# Altium footprint library Connectors_Old.PcbLib: 246 footprints (part 1 of 18)
Each footprint in its own frame and in the unit in brackets; x right, y up, seen from the top. Pads: shape width x height; smd on the part's side, far side on the other; paste and mask are expansions set on the pad; w line width, h text height; cw(c..) or ccw(c..) is an arc to the next point about the centre after c.
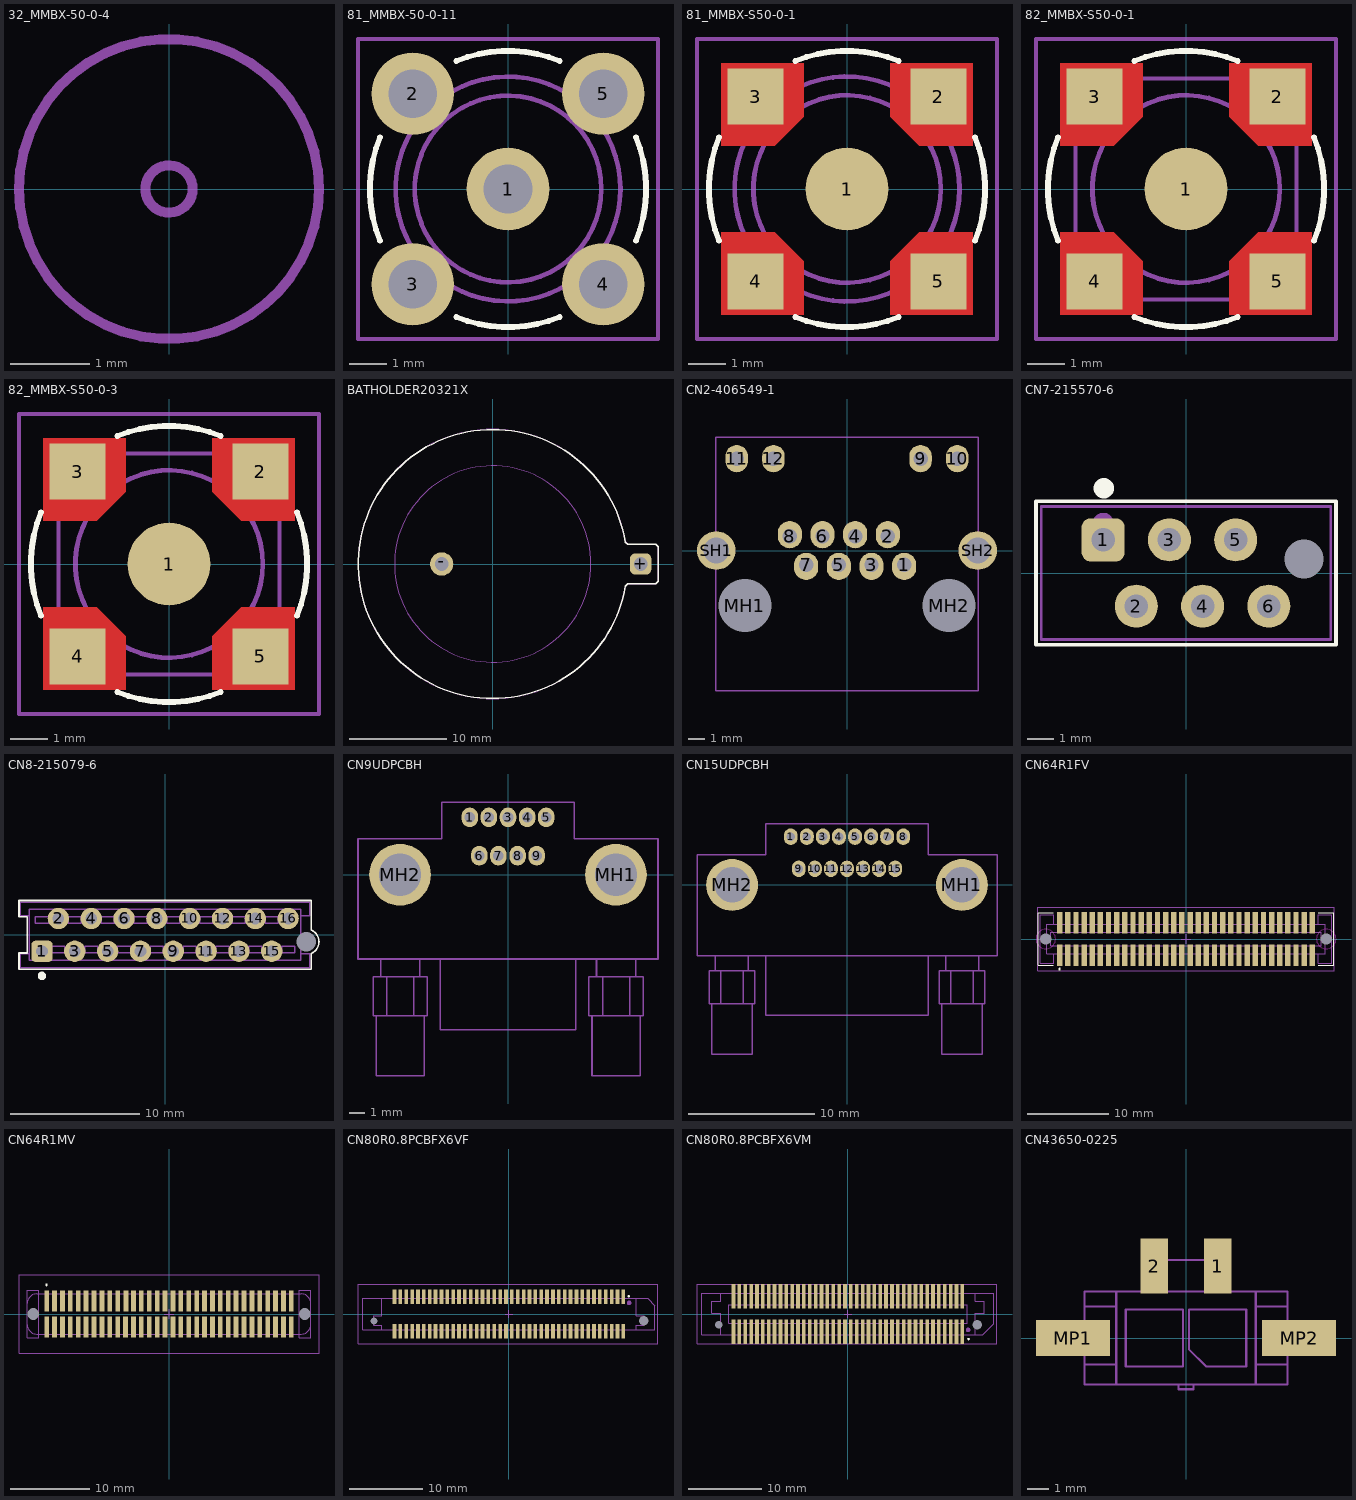
[diagram p0: the footprints below, top view; thin cyan lines are the x and y axes]

## 32_MMBX-50-0-4 [mm] "MMBX adapter 8mm"
height 9
Mechanical 13:
  circle w0.127: c0,0 r0.3
  circle w0.127: c0,0 r1.9
3D body: height 9, standoff 1, extent -1.9,-1.899 1.899,1.899

## 81_MMBX-50-0-11 [mm]
pads (5):
  round 2.2 hole 1.3: 1(0,0) 2(-2.54,2.54) 3(-2.54,-2.54) 4(2.54,-2.54) 5(2.54,2.54)
Top Overlay:
  lines w0.15: -3.415,-1.38 cw(c0,0) -3.415,1.38 ; -1.38,-3.415 ccw(c0,0) 1.38,-3.415 ; -1.38,3.415 cw(c0,0) 1.38,3.415 ; 3.415,-1.38 ccw(c0,0) 3.415,1.38
Mechanical 13:
  circle w0.127: c0,0 r2.997
  circle w0.127: c0,0 r2.489
  circle w0.508: c0,0 r0.254
Mechanical 15:
  lines w0.102: -0.55,0 0.55,0 ; 0,-0.6 0,0.6 ; -4,-4 -4,4 4,4 4,-4 -4,-4
3D body: height 9.02, standoff -3.38, extent -3.065,-3.065 3.065,3.065

## 81_MMBX-S50-0-1 [mm] "MMBX connector, PCB plug (male), SMD"
height 6.1
pads (5):
  round 2.2 smd: 1(0,0)
  rect 1.5x1.5 smd: 2(2.438,2.464) 3(-2.438,2.464) 4(-2.438,-2.464) 5(2.438,-2.464)
Top Layer:
  region: 1.15,1.93 1.93,1.15 3.35,1.15 3.35,3.35 1.15,3.35
  region: -1.15,1.93 -1.93,1.15 -3.35,1.15 -3.35,3.35 -1.15,3.35
  region: -1.15,-1.93 -1.93,-1.15 -3.35,-1.15 -3.35,-3.35 -1.15,-3.35
  region: 1.15,-1.93 1.93,-1.15 3.35,-1.15 3.35,-3.35 1.15,-3.35
Top Overlay:
  lines w0.15: -3.415,-1.38 cw(c0,0) -3.415,1.38 ; -1.38,-3.415 ccw(c0,0) 1.38,-3.415 ; -1.38,3.415 cw(c0,0) 1.38,3.415 ; 3.415,-1.38 ccw(c0,0) 3.415,1.38
Top Paste:
  region: 1.15,3.35 1.15,1.93 1.93,1.15 3.35,1.15 3.35,3.35
  region: -1.15,3.35 -1.15,1.93 -1.93,1.15 -3.35,1.15 -3.35,3.35
  region: -1.15,-3.35 -1.15,-1.93 -1.93,-1.15 -3.35,-1.15 -3.35,-3.35
  region: 1.15,-3.35 1.15,-1.93 1.93,-1.15 3.35,-1.15 3.35,-3.35
Top Solder:
  region: 1.016,3.48 1.016,1.778 1.778,1.016 3.48,1.016 3.48,3.48
  region: -1.016,3.48 -1.016,1.778 -1.778,1.016 -3.48,1.016 -3.48,3.48
  region: -1.016,-3.48 -1.016,-1.778 -1.778,-1.016 -3.48,-1.016 -3.48,-3.48
  region: 1.016,-3.48 1.016,-1.778 1.778,-1.016 3.48,-1.016 3.48,-3.48
Mechanical 13:
  circle w0.127: c0,0 r3
  circle w0.127: c0,0 r2.5
  lines w0.102: -2.667,-1.397 -3.048,-1.397 -3.048,-3.048 -1.377,-3.048 -1.377,-2.707 ; -2.667,1.397 -3.048,1.397 -3.048,3.048 -1.377,3.048 -1.377,2.707 ; 1.377,-2.707 1.377,-3.048 3.048,-3.048 3.048,-1.397 2.667,-1.397 ; 1.377,2.707 1.377,3.048 3.048,3.048 3.048,1.397 2.667,1.397
Mechanical 15:
  lines w0.102: -0.55,0 0.55,0 ; 0,-0.6 0,0.6 ; -4,-4 -4,4 4,4 4,-4 -4,-4
3D body: height 5.77, standoff 0.02, extent -3.066,-3.066 3.066,3.066

## 82_MMBX-S50-0-1 [mm] "MMBX connector, PCB plug (female), SMD"
height 3.1
pads (5):
  round 2.2 smd: 1(0,0)
  rect 1.5x1.5 smd: 2(2.438,2.464) 3(-2.438,2.464) 4(-2.438,-2.464) 5(2.438,-2.464)
Top Layer:
  region: 1.15,1.93 1.93,1.15 3.35,1.15 3.35,3.35 1.15,3.35
  region: -1.15,1.93 -1.93,1.15 -3.35,1.15 -3.35,3.35 -1.15,3.35
  region: -1.15,-1.93 -1.93,-1.15 -3.35,-1.15 -3.35,-3.35 -1.15,-3.35
  region: 1.15,-1.93 1.93,-1.15 3.35,-1.15 3.35,-3.35 1.15,-3.35
Top Overlay:
  lines w0.15: -3.415,-1.38 cw(c0,0) -3.415,1.38 ; -1.38,-3.415 ccw(c0,0) 1.38,-3.415 ; -1.38,3.415 cw(c0,0) 1.38,3.415 ; 3.415,-1.38 ccw(c0,0) 3.415,1.38
Top Paste:
  region: 1.15,3.35 1.15,1.93 1.93,1.15 3.35,1.15 3.35,3.35
  region: -1.15,3.35 -1.15,1.93 -1.93,1.15 -3.35,1.15 -3.35,3.35
  region: -1.15,-3.35 -1.15,-1.93 -1.93,-1.15 -3.35,-1.15 -3.35,-3.35
  region: 1.15,-3.35 1.15,-1.93 1.93,-1.15 3.35,-1.15 3.35,-3.35
Top Solder:
  region: 1.016,3.48 1.016,1.778 1.778,1.016 3.48,1.016 3.48,3.48
  region: -1.016,3.48 -1.016,1.778 -1.778,1.016 -3.48,1.016 -3.48,3.48
  region: -1.016,-3.48 -1.016,-1.778 -1.778,-1.016 -3.48,-1.016 -3.48,-3.48
  region: 1.016,-3.48 1.016,-1.778 1.778,-1.016 3.48,-1.016 3.48,-3.48
Mechanical 13:
  circle w0.127: c0,0 r2.5
  lines w0.102: 2.616,-2.95 2.95,-2.616 2.95,2.616 2.616,2.95 -2.616,2.95 -2.95,2.616 -2.95,-2.616 -2.616,-2.95 2.642,-2.95
Mechanical 15:
  lines w0.102: -0.55,0 0.55,0 ; 0,-0.6 0,0.6 ; -4,-4 -4,4 4,4 4,-4 -4,-4
3D body: height 3.12, standoff 0.02, extent -3.066,-3.066 3.066,3.066

## 82_MMBX-S50-0-3 [mm] "MMBX connector, PCB plug (male), SMD"
height 9
pads (5):
  round 2.2 smd: 1(0,0)
  rect 1.5x1.5 smd: 2(2.438,2.464) 3(-2.438,2.464) 4(-2.438,-2.464) 5(2.438,-2.464)
Top Layer:
  region: 1.15,1.93 1.93,1.15 3.35,1.15 3.35,3.35 1.15,3.35
  region: -1.15,1.93 -1.93,1.15 -3.35,1.15 -3.35,3.35 -1.15,3.35
  region: -1.15,-1.93 -1.93,-1.15 -3.35,-1.15 -3.35,-3.35 -1.15,-3.35
  region: 1.15,-1.93 1.93,-1.15 3.35,-1.15 3.35,-3.35 1.15,-3.35
Top Overlay:
  lines w0.15: -3.415,-1.38 cw(c0,0) -3.415,1.38 ; -1.38,-3.415 ccw(c0,0) 1.38,-3.415 ; -1.38,3.415 cw(c0,0) 1.38,3.415 ; 3.415,-1.38 ccw(c0,0) 3.415,1.38
Top Paste:
  region: 1.15,3.35 1.15,1.93 1.93,1.15 3.35,1.15 3.35,3.35
  region: -1.15,3.35 -1.15,1.93 -1.93,1.15 -3.35,1.15 -3.35,3.35
  region: -1.15,-3.35 -1.15,-1.93 -1.93,-1.15 -3.35,-1.15 -3.35,-3.35
  region: 1.15,-3.35 1.15,-1.93 1.93,-1.15 3.35,-1.15 3.35,-3.35
Top Solder:
  region: 1.016,3.48 1.016,1.778 1.778,1.016 3.48,1.016 3.48,3.48
  region: -1.016,3.48 -1.016,1.778 -1.778,1.016 -3.48,1.016 -3.48,3.48
  region: -1.016,-3.48 -1.016,-1.778 -1.778,-1.016 -3.48,-1.016 -3.48,-3.48
  region: 1.016,-3.48 1.016,-1.778 1.778,-1.016 3.48,-1.016 3.48,-3.48
Mechanical 13:
  circle w0.127: c0,0 r2.5
  lines w0.102: 2.616,-2.95 2.95,-2.616 2.95,2.616 2.616,2.95 -2.616,2.95 -2.95,2.616 -2.95,-2.616 -2.616,-2.95 2.642,-2.95
Mechanical 15:
  lines w0.102: -0.55,0 0.55,0 ; 0,-0.6 0,0.6 ; -4,-4 -4,4 4,4 4,-4 -4,-4
3D body: height 3.47, standoff 0.01, extent -2.95,-2.947 2.95,2.954

## BATHOLDER20321X [mm]
height 8.509
pads (2):
  rrect50% 2.2x2.2 hole 1.4: +(15.24,0)
  round 2.4 hole 1.4: -(-5.258,0)
Top Overlay:
  lines w0.15: 13.653,-2.284 cw(c0,0) 13.658,2.255 13.881,2.032 16.764,2.032 17.018,1.778 17.018,-1.778 16.764,-2.032 13.905,-2.032 13.653,-2.284
Mechanical 13:
  circle w0.102: c0,0 r10.109
  lines w0.102: 13.675,2.275 13.918,2.032 16.764,2.032 17.018,1.778 17.018,-1.795 16.764,-2.049 13.911,-2.049 13.68,-2.28 cw(c0,0) 13.68,2.28

## CN2-406549-1 [mm] "Connector RJ45 for AMC 8pin pressfit 15.75x16.3x13.97"
height 7.38
pads (16):
  oval 1.5x1.7 hole 0.9 copper offset 0,-0.1: 1(3.556,-0.889) 3(1.524,-0.889) 5(-0.508,-0.889) 7(-2.54,-0.889)
  oval 1.5x1.7 hole 0.9 copper offset 0,0.1: 2(2.54,0.889) 4(0.508,0.889) 6(-1.524,0.889) 8(-3.556,0.889)
  oval 1.4x1.7 hole 0.9: 9(4.572,5.715) 10(6.858,5.715) 11(-6.858,5.715) 12(-4.572,5.715)
  round 3 hole 3.3 unplated: MH1(-6.35,-3.429) MH2(6.35,-3.429)
  round 2.4 hole 1.6: SH1(-8.128,0) SH2(8.128,0)
Mechanical 13:
  lines w0.1: -8.15,-8.712 -8.15,7.036 8.15,7.036 8.15,-8.712 -8.15,-8.712
3D body: height 14.61, standoff -4.11, extent -9.313,-9.685 9.315,7.036

## CN7-215570-6 [mil] "AMP u Match 6pin vertical female"
height 118.11
pads (7):
  round 0 hole 59.06 unplated paste-90 mask+43: 0(178.15,20.87)
  rrect40% 65x65 hole 35.43: 1(-125,50)
  round 65 hole 35.43: 2(-75,-50) 3(-25,50) 4(25,-50) 5(75,50) 6(125,-50)
Top Overlay:
  circle w15.75: c-124.02,127.95 r7.48
  lines w5.91: -226.38,-108.27 -226.38,108.27 226.38,108.27 226.38,-108.27 -226.38,-108.27
Mechanical 13:
  circle w15.75: c-125,75 r7.87
  lines w4: -218.5,-100.39 -218.5,100.39 218.5,100.39 218.5,-100.39 -218.5,-100.39 ; -145,35 -145,55 -105,55 -105,35 -145,35 ; -95,-55 -55,-55 -55,-35 -95,-35 -95,-55 ; -45,35 -5,35 -5,55 -45,55 -45,35 ; 5,-55 45,-55 45,-35 5,-35 5,-55 ; 55,35 95,35 95,55 55,55 55,35 ; 105,-55 145,-55 145,-35 105,-35 105,-55
3D body: height 198.82, standoff -124.02, extent -216.07,-98.43 217,98.43

## CN8-215079-6 [mil] "AMP u Match 16pin vertical cable"
height 118.11
pads (17):
  rrect40% 65x65 hole 35.43: 1(-375,-50)
  round 65 hole 35.43: 2(-325,50) 3(-275,-50) 4(-225,50) 5(-175,-50) 6(-125,50) 7(-75,-50) 8(-25,50) 9(25,-50) 10(75,50) 11(125,-50) 12(175,50) 13(225,-50) 14(275,50) 15(325,-50) 16(375,50)
  round 0 hole 59.06 unplated mask+35.43: MH1(430.12,-20.87)
Top Overlay:
  circle w15.75: c-375,-125 r5
  lines w5: 445,-56.71 445,-105 -445,-105 -445,-55 -420,-55 -420,55 -445,55 -445,105 445,105 445,15 ; 445.04,-56.71 ccw(c430.12,-20.87) 445.04,14.98
Mechanical 13:
  circle w15.75: c-375,-50 r7.87
  lines w4: -413.39,-58.07 -440.94,-58.07 -440.94,-100 440.94,-100 440.94,-58.07 413.39,-58.07 ; -413.39,58.07 -440.94,58.07 -440.94,100 440.94,100 440.94,58.07 413.39,58.07 ; -413.39,-77.76 -413.39,77.76 413.39,77.76 413.39,-77.76 -413.39,-77.76 ; -395,35 -395,55 -355,55 -355,35 -395,35 ; -345,-55 -305,-55 -305,-35 -345,-35 -345,-55 ; -295,35 -255,35 -255,55 -295,55 -295,35 ; -245,-55 -205,-55 -205,-35 -245,-35 -245,-55 ; -195,35 -155,35 -155,55 -195,55 -195,35 ; -145,-55 -105,-55 -105,-35 -145,-35 -145,-55 ; -95,35 -95,55 -55,55 -55,35 -95,35 ; -45,-55 -45,-35 -5,-35 -5,-55 -45,-55 ; 5,35 5,55 45,55 45,35 5,35 ; 55,-55 55,-35 95,-35 95,-55 55,-55 ; 105,35 105,55 145,55 145,35 105,35 ; 155,-55 155,-35 195,-35 195,-55 155,-55 ; 205,35 205,55 245,55 245,35 205,35 ; 255,-55 255,-35 295,-35 295,-55 255,-55 ; 305,35 305,55 345,55 345,35 305,35 ; 355,-55 355,-35 395,-35 395,-55 355,-55
3D body: height 157.48, standoff -118.11, extent -437.01,-98.43 438.98,98.43

## CN9UDPCBH [mm] "Connector LXI Horizontal, THDM; 9 pin; R1.27 mm; Body 19.94 x 15.13 x 7.86 mm (LxWxH)"
height 7.82
pads (11):
  oval 1.1x1.3 hole 0.7 mask+0.051: 1(-2.54,3.81) 2(-1.27,3.81) 3(0,3.81) 4(1.27,3.81) 5(2.54,3.81) 6(-1.905,1.27) 7(-0.635,1.27) 8(0.635,1.27) 9(1.905,1.27)
  round 4.1 hole 2.8: MH1(7.175,0) MH2(-7.175,0)
Mechanical 13:
  lines w0.102: -8.767,-9.372 -8.767,-13.372 -5.567,-13.372 -5.567,-9.372 ; -8.467,-6.772 -8.467,-5.6 ; -8.067,-9.372 -8.067,-6.772 ; -6.267,-9.372 -6.267,-6.772 ; -5.867,-6.772 -5.867,-5.6 ; -4.5,-5.6 -4.5,-10.3 4.5,-10.3 4.5,-5.6 ; 5.583,-9.372 5.583,-13.372 8.783,-13.372 8.783,-9.372 ; 5.883,-6.772 5.883,-5.6 ; 6.283,-9.372 6.283,-6.772 ; 8.083,-9.372 8.083,-6.772 ; 8.483,-6.772 8.483,-5.6 ; -9.97,-5.6 9.97,-5.6 9.97,2.4 4.4,2.4 4.4,4.83 -4.4,4.83 -4.4,2.4 -9.97,2.4 -9.97,-5.6 ; -8.967,-9.372 -5.367,-9.372 -5.367,-6.772 -8.967,-6.772 -8.967,-9.372 ; 5.383,-9.372 8.983,-9.372 8.983,-6.772 5.383,-6.772 5.383,-9.372
3D body: height 5.4, standoff 2.21, extent 5.583,-13.382 8.776,-9.382
3D body: height 5.6, standoff 2.01, extent 5.383,-9.382 8.975,-6.782
3D body: height 5.1, standoff 2.51, extent 5.883,-6.782 8.477,-5.6
3D body: height 5.4, standoff 2.21, extent -8.767,-13.382 -5.574,-9.382
3D body: height 5.6, standoff 2.01, extent -8.967,-9.382 -5.375,-6.782
3D body: height 5.1, standoff 2.51, extent -8.467,-6.782 -5.873,-5.6
3D body: height 0, standoff -2.8, extent 5.753,-1.409 8.571,1.409
3D body: height 0, standoff -2.8, extent -8.597,-1.409 -5.779,1.409
3D body: height 0, standoff -2.8, extent -2.268,0.907 -1.542,1.633
3D body: height 0, standoff -2.8, extent -0.998,0.907 -0.272,1.633
3D body: height 0, standoff -2.8, extent 0.272,0.907 0.998,1.633
3D body: height 0, standoff -2.8, extent 1.542,0.907 2.268,1.633
3D body: height 0, standoff -2.8, extent 2.177,3.447 2.903,4.173
3D body: height 0, standoff -2.8, extent 0.907,3.447 1.633,4.173
3D body: height 0, standoff -2.8, extent -0.363,3.447 0.363,4.173
3D body: height 0, standoff -2.8, extent -1.633,3.447 -0.907,4.173
3D body: height 0, standoff -2.8, extent -2.903,3.447 -2.177,4.173
3D body: height 7.82, standoff 0, extent -9.97,-5.2 9.97,4.83
3D body: height 7.82, standoff 0, extent -9.97,-5.6 9.97,-5.2
3D body: height 7.11, standoff 0.51, extent -4.5,-10.3 4.5,-5.6
3D body: height 6.01, standoff 1.61, extent -3.9,-10.4 3.9,-10.3

## CN15UDPCBH [mm] "Connector LXI Horizontal, THDM; 9 pin; R1.27 mm; Body 19.94 x 15.13 x 7.86 mm (LxWxH)"
height 7.82
pads (17):
  oval 1.1x1.3 hole 0.7 mask+0.051: 1(-4.445,3.81) 2(-3.175,3.81) 3(-1.905,3.81) 4(-0.635,3.81) 5(0.635,3.81) 6(1.905,3.81) 7(3.175,3.81) 8(4.445,3.81) 9(-3.81,1.27) 10(-2.54,1.27) 11(-1.27,1.27) 12(0,1.27) 13(1.27,1.27) 14(2.54,1.27) 15(3.81,1.27)
  round 4.1 hole 2.8: MH1(9.08,0) MH2(-9.08,0)
Mechanical 13:
  lines w0.102: -10.689,-9.372 -10.689,-13.372 -7.489,-13.372 -7.489,-9.372 ; -10.389,-6.772 -10.389,-5.6 ; -9.989,-9.372 -9.989,-6.772 ; -8.189,-9.372 -8.189,-6.772 ; -7.789,-6.772 -7.789,-5.6 ; -6.426,-5.602 -6.426,-10.302 6.426,-10.287 6.426,-5.587 ; 7.489,-9.372 7.489,-13.372 10.689,-13.372 10.689,-9.372 ; 7.789,-6.772 7.789,-5.6 ; 8.189,-9.372 8.189,-6.772 ; 9.989,-9.372 9.989,-6.772 ; 10.389,-6.772 10.389,-5.6 ; -11.849,-5.6 11.849,-5.6 11.849,2.4 6.426,2.4 6.426,4.83 -6.426,4.83 -6.426,2.4 -11.849,2.4 -11.849,-5.6 ; -10.889,-9.372 -7.289,-9.372 -7.289,-6.772 -10.889,-6.772 -10.889,-9.372 ; 7.289,-9.372 10.889,-9.372 10.889,-6.772 7.289,-6.772 7.289,-9.372
3D body: height 0, standoff -2.8, extent 7.67,-1.409 10.489,1.409
3D body: height 0, standoff -2.8, extent -10.49,-1.409 -7.671,1.409
3D body: height 0, standoff -2.8, extent -4.173,0.907 -3.447,1.633
3D body: height 0, standoff -2.8, extent -2.903,0.907 -2.177,1.633
3D body: height 0, standoff -2.8, extent 3.447,0.907 4.173,1.633
3D body: height 0, standoff -2.8, extent 0.907,0.907 1.633,1.633
3D body: height 0, standoff -2.8, extent 4.082,3.447 4.808,4.173
3D body: height 0, standoff -2.8, extent -3.538,3.447 -2.812,4.173
3D body: height 0, standoff -2.8, extent -4.808,3.447 -4.082,4.173
3D body: height 7.82, standoff 0, extent -11.849,-5.232 11.849,4.83
3D body: height 7.82, standoff 0, extent -11.849,-5.6 11.849,-5.2
3D body: height 7.11, standoff 0.51, extent -6.426,-10.302 6.426,-5.6
3D body: height 6.01, standoff 1.61, extent -5.807,-10.4 5.806,-10.3
3D body: height 5.11, standoff 2.51, extent -10.389,-6.77 -7.799,-5.6
3D body: height 0, standoff -2.8, extent -0.363,0.907 0.363,1.633
3D body: height 0, standoff -2.8, extent -1.633,0.907 -0.907,1.633
3D body: height 0, standoff -2.8, extent -2.268,3.447 -1.542,4.173
3D body: height 0, standoff -2.8, extent -0.998,3.447 -0.272,4.173
3D body: height 0, standoff -2.8, extent 0.272,3.447 0.998,4.173
3D body: height 0, standoff -2.8, extent 1.542,3.447 2.268,4.173
3D body: height 0, standoff -2.8, extent 2.812,3.447 3.538,4.173
3D body: height 0, standoff -2.8, extent 2.177,0.907 2.903,1.633
3D body: height 5.61, standoff 2.01, extent -10.887,-9.37 -7.301,-6.77
3D body: height 5.41, standoff 2.21, extent -10.694,-13.372 -7.506,-9.372
3D body: height 5.41, standoff 2.21, extent 7.506,-13.37 10.694,-9.37
3D body: height 5.61, standoff 2.01, extent 7.307,-9.37 10.893,-6.77
3D body: height 5.11, standoff 2.51, extent 7.805,-6.77 10.395,-5.6

## CN64R1FV [mm] "71439-0864"
height 5
pads (66):
  rect 0.66x2.642 smd: 1(-15.5,-2) 2(-15.5,2) 3(-14.5,-2) 4(-14.5,2) 5(-13.5,-2) 6(-13.5,2) 7(-12.5,-2) 8(-12.5,2) 9(-11.5,-2) 10(-11.5,2) 11(-10.5,-2) 12(-10.5,2) 13(-9.5,-2) 14(-9.5,2) 15(-8.5,-2) 16(-8.5,2) 17(-7.5,-2) 18(-7.5,2) 19(-6.5,-2) 20(-6.5,2) 21(-5.5,-2) 22(-5.5,2) 23(-4.5,-2) 24(-4.5,2) 25(-3.5,-2) 26(-3.5,2) 27(-2.5,-2) 28(-2.5,2) 29(-1.5,-2) 30(-1.5,2) 31(-0.5,-2) 32(-0.5,2) 33(0.5,-2) 34(0.5,2) 35(1.5,-2) 36(1.5,2) 37(2.5,-2) 38(2.5,2) 39(3.5,-2) 40(3.5,2) 41(4.5,-2) 42(4.5,2) 43(5.5,-2) 44(5.5,2) 45(6.5,-2) 46(6.5,2) 47(7.5,-2) 48(7.5,2) 49(8.5,-2) 50(8.5,2) 51(9.5,-2) 52(9.5,2) 53(10.5,-2) 54(10.5,2) 55(11.5,-2) 56(11.5,2) 57(12.5,-2) 58(12.5,2) 59(13.5,-2) 60(13.5,2) 61(14.5,-2) 62(14.5,2) 63(15.5,-2) 64(15.5,2)
  round 0.5 hole 1.4 unplated mask+0.5: MH1(-17.2,0)
  round 0.5 hole 1.4 unplated: MH2(17.2,0)
Top Overlay:
  circle w0.15: c-15.5,-3.7 r0.1
  lines w0.15: -16.3,-3.2 -18.1,-3.2 -18.1,3.2 -16.3,3.2 ; 16.2,-3.2 18.1,-3.2 18.1,3.2 16.2,3.2
Top Solder:
  circle w1.016: c17.2,0 r0.508
  circle w1.016: c-17.2,0 r0.508
Bottom Solder:
  circle w1.016: c17.2,0 r0.508
  circle w1.016: c-17.2,0 r0.508
Keep-Out Layer:
  circle w0.1: c17.2,0 r1.2
  circle w0.1: c-17.2,0 r1.2
Mechanical 13:
  circle w0.102: c-15.494,-1.321 r0.254
  lines w0.127: -16.2,-1.8 -16.2,-3 -17.9,-3 -17.9,3 -16.2,3 -16.2,1.8 ; 16.2,-1.8 17.1,-1.8 17.1,1.8 16.2,1.8 ; 16.2,-1.8 -17.1,-1.8 -17.1,1.8 16.2,1.8 ; 16.2,-1.8 16.2,-3 17.9,-3 17.9,3 16.2,3 16.2,1.8 ; -16.6,-0.8 -16.6,0.8 16.6,0.8 16.6,-0.8 -16.6,-0.8
Mechanical 15:
  lines w0.102: -0.6,0 0.6,0 ; 0,-0.6 0,0.6
  lines w0.127: -18.2,-3.9 -18.2,3.9 18.2,3.9 18.2,-3.9 -18.2,-3.9
3D body: height 5.3, standoff 3, extent -17.107,0.5 17.107,1.807
3D body: height 3, standoff 0.5, extent -17.114,-1.807 17.107,1.814
3D body: height 5.3, standoff 3, extent -17.107,-1.807 17.107,-0.5
3D body: height 1, standoff 0, extent 16.2,-3 17.9,3
3D body: height 1, standoff 0, extent -17.9,-3 -16.2,3

## CN64R1MV [mm] "Connector 64 pin R1.0 pitch plug"
height 8.35
pads (66):
  rect 0.6x2.7 smd: 1(-15.5,1.65) 2(-15.5,-1.65) 3(-14.5,1.65) 4(-14.5,-1.65) 5(-13.5,1.65) 6(-13.5,-1.65) 7(-12.5,1.65) 8(-12.5,-1.65) 9(-11.5,1.65) 10(-11.5,-1.65) 11(-10.5,1.65) 12(-10.5,-1.65) 13(-9.5,1.65) 14(-9.5,-1.65) 15(-8.5,1.65) 16(-8.5,-1.65) 17(-7.5,1.65) 18(-7.5,-1.65) 19(-6.5,1.65) 20(-6.5,-1.65) 21(-5.461,1.651) 22(-5.5,-1.65) 23(-4.5,1.65) 24(-4.5,-1.65) 25(-3.5,1.65) 26(-3.5,-1.65) 27(-2.5,1.65) 28(-2.5,-1.65) 29(-1.5,1.65) 30(-1.5,-1.65) 31(-0.5,1.65) 32(-0.5,-1.65) 33(0.5,1.65) 34(0.5,-1.65) 35(1.5,1.65) 36(1.5,-1.65) 37(2.5,1.65) 38(2.5,-1.65) 39(3.5,1.65) 40(3.5,-1.65) 41(4.5,1.65) 42(4.5,-1.65) 43(5.5,1.65) 44(5.5,-1.65) 45(6.5,1.65) 46(6.5,-1.65) 47(7.5,1.65) 48(7.5,-1.65) 49(8.5,1.65) 50(8.5,-1.65) 51(9.5,1.65) 52(9.5,-1.65) 53(10.5,1.65) 54(10.5,-1.65) 55(11.5,1.65) 56(11.5,-1.65) 57(12.5,1.65) 58(12.5,-1.65) 59(13.5,1.65) 60(13.5,-1.65) 61(14.5,1.65) 62(14.5,-1.65) 63(15.5,1.65) 64(15.5,-1.65)
  round 0 hole 1.5 unplated mask+1: MH1(-17.2,0) MH2(17.2,0)
Top Overlay:
  circle w0.15: c-15.5,3.7 r0.1
Bottom Solder:
  circle w1.016: c17.2,0 r0.508
  circle w1.016: c-17.2,0 r0.508
Mechanical 13:
  lines w0.102: -17.95,-1.351 ccw(c-16.764,-1.351) -16.764,-2.537 16.764,-2.537 ccw(c16.764,-1.351) 17.95,-1.351 ; -17.95,1.351 cw(c-16.764,1.351) -16.764,2.537 16.764,2.537 cw(c16.764,1.351) 17.95,1.351 ; -17.95,-3.025 -17.95,3.025 -16.5,3.025 -16.5,-3.025 -17.95,-3.025 ; 16.5,-3.025 16.5,3.025 17.95,3.025 17.95,-3.025 16.5,-3.025
Mechanical 15:
  lines w0.102: -0.6,0 0.6,0 ; 0,-0.6 0,0.6
  lines w0.127: -19,-5 -19,5 19,5 19,-5 -19,-5
3D body: height 8.35, standoff 4, extent -16,-0.7 16.1,0.7
3D body: height 3, standoff 0, extent -17.95,-3.025 -16.5,3.025
3D body: height 3, standoff 0, extent 16.5,-3.025 17.95,3.025
3D body: height 8.35, standoff 3, extent -17.96,0 17.96,2.547
3D body: height 8.35, standoff 3, extent -17.96,-2.547 17.96,0
3D body: height 4, standoff 3, extent -17.96,-2.547 17.96,2.547
3D body: height 0, standoff -0.76, extent -17.964,-0.743 -16.453,0.743
3D body: height 0, standoff -0.76, extent 16.453,-0.743 17.964,0.743

## CN80R0.8PCBFX6VF [mm] "0.8mm Pitch Stacking Height 6mm Header-Stacking Connector female"
height 6
pads (82):
  rect 0.5x2 smd: 1(15.6,2.35) 2(15.6,-2.35) 3(14.8,2.35) 4(14.8,-2.35) 5(14,2.35) 6(14,-2.35) 7(13.2,2.35) 8(13.2,-2.35) 9(12.4,2.35) 10(12.4,-2.35) 11(11.6,2.35) 12(11.6,-2.35) 13(10.8,2.35) 14(10.8,-2.35) 15(10,2.35) 16(10,-2.35) 17(9.2,2.35) 18(9.2,-2.35) 19(8.4,2.35) 20(8.4,-2.35) 21(7.6,2.35) 22(7.6,-2.35) 23(6.8,2.35) 24(6.8,-2.35) 25(6,2.35) 26(6,-2.35) 27(5.2,2.35) 28(5.2,-2.35) 29(4.4,2.35) 30(4.4,-2.35) 31(3.6,2.35) 32(3.6,-2.35) 33(2.8,2.35) 34(2.8,-2.35) 35(2,2.35) 36(2,-2.35) 37(1.2,2.35) 38(1.2,-2.35) 39(0.4,2.35) 40(0.4,-2.35) 41(-0.4,2.35) 42(-0.4,-2.35) 43(-1.2,2.35) 44(-1.2,-2.35) 45(-2,2.35) 46(-2,-2.35) 47(-2.8,2.35) 48(-2.8,-2.35) 49(-3.6,2.35) 50(-3.6,-2.35) 51(-4.4,2.35) 52(-4.4,-2.35) 53(-5.2,2.35) 54(-5.2,-2.35) 55(-6,2.35) 56(-6,-2.35) 57(-6.8,2.35) 58(-6.8,-2.35) 59(-7.6,2.35) 60(-7.6,-2.35) 61(-8.4,2.35) 62(-8.4,-2.35) 63(-9.2,2.35) 64(-9.2,-2.35) 65(-10,2.35) 66(-10,-2.35) 67(-10.8,2.35) 68(-10.8,-2.35) 69(-11.6,2.35) 70(-11.6,-2.35) 71(-12.4,2.35) 72(-12.4,-2.35) 73(-13.2,2.35) 74(-13.2,-2.35) 75(-14,2.35) 76(-14,-2.35) 77(-14.8,2.35) 78(-14.8,-2.35) 79(-15.6,2.35) 80(-15.6,-2.35)
  round 0 hole 1.3 unplated: MH1(18.4,-0.95)
  round 0 hole 1 unplated: MH2(-18.4,-0.95)
Top Overlay:
  circle w0.178: c16.309,2.413 r0.074
Mechanical 13:
  circle w0.381: c16.385,1.524 r0.125
  lines w0.102: -17.35,2.15 -17.35,0.635 -17.35,-0.205 -18.45,-0.205 -18.45,-1.524 -17.35,-1.524 -17.348,-1.524 -17.348,-2.15 ; 17.348,-2.15 17.348,-1.524 17.35,-1.524 18.45,-1.524 18.45,-0.205 17.35,-0.205 17.35,0.635 17.35,2.15
  lines w0.127: -19.9,-2.15 19.9,-2.15 19.9,1.15 18.9,2.15 -19.9,2.15 -19.9,-2.15
Mechanical 15:
  lines w0.102: -0.5,0 0.5,0 ; 0,-0.5 0,0.5 ; -20.574,-4.064 20.32,-4.064 20.32,4.064 -20.066,4.064 -20.574,4.064 -20.574,-4.064
3D body: height 6.8, standoff 3, extent -18.452,-1.524 -17.35,-0.205
3D body: height 6.8, standoff 3, extent 17.35,-1.524 18.452,-0.205
3D body: height 5.9, standoff 3, extent -15.85,-1.778 -15.367,-1.6
3D body: height 5.9, standoff 3, extent -15.05,-1.778 -14.567,-1.6
3D body: height 5.9, standoff 3, extent -14.25,-1.778 -13.767,-1.6
3D body: height 5.9, standoff 3, extent -13.45,-1.778 -12.967,-1.6
3D body: height 5.9, standoff 3, extent -12.65,-1.778 -12.167,-1.6
3D body: height 5.9, standoff 3, extent -11.85,-1.778 -11.367,-1.6
3D body: height 5.9, standoff 3, extent -11.05,-1.778 -10.567,-1.6
3D body: height 5.9, standoff 3, extent -10.25,-1.778 -9.767,-1.6
3D body: height 5.9, standoff 3, extent -9.45,-1.778 -8.967,-1.6
3D body: height 5.9, standoff 3, extent -8.65,-1.778 -8.167,-1.6
3D body: height 5.9, standoff 3, extent -7.85,-1.778 -7.367,-1.6
3D body: height 5.9, standoff 3, extent -7.05,-1.778 -6.567,-1.6
3D body: height 5.9, standoff 3, extent -6.25,-1.778 -5.767,-1.6
3D body: height 5.9, standoff 3, extent -5.45,-1.778 -4.967,-1.6
3D body: height 5.9, standoff 3, extent -4.65,-1.778 -4.167,-1.6
3D body: height 5.9, standoff 3, extent -3.85,-1.778 -3.367,-1.6
3D body: height 5.9, standoff 3, extent -3.05,-1.778 -2.567,-1.6
3D body: height 5.9, standoff 3, extent -2.25,-1.778 -1.767,-1.6
3D body: height 5.9, standoff 3, extent -1.45,-1.778 -0.967,-1.6
3D body: height 5.9, standoff 3, extent -0.65,-1.778 -0.167,-1.6
3D body: height 5.9, standoff 3, extent 0.15,-1.778 0.633,-1.6
3D body: height 5.9, standoff 3, extent 0.95,-1.778 1.433,-1.6
3D body: height 5.9, standoff 3, extent 1.75,-1.778 2.233,-1.6
3D body: height 5.9, standoff 3, extent 2.55,-1.778 3.033,-1.6
3D body: height 5.9, standoff 3, extent 3.35,-1.778 3.833,-1.6
3D body: height 5.9, standoff 3, extent 4.15,-1.778 4.633,-1.6
3D body: height 5.9, standoff 3, extent 4.95,-1.778 5.433,-1.6
3D body: height 5.9, standoff 3, extent 5.75,-1.778 6.233,-1.6
3D body: height 5.9, standoff 3, extent 6.55,-1.778 7.033,-1.6
3D body: height 5.9, standoff 3, extent 7.35,-1.778 7.833,-1.6
3D body: height 5.9, standoff 3, extent 8.15,-1.778 8.633,-1.6
3D body: height 5.9, standoff 3, extent 8.95,-1.778 9.433,-1.6
3D body: height 5.9, standoff 3, extent 9.75,-1.778 10.233,-1.6
3D body: height 5.9, standoff 3, extent 10.55,-1.778 11.033,-1.6
3D body: height 5.9, standoff 3, extent 11.35,-1.778 11.833,-1.6
3D body: height 5.9, standoff 3, extent 12.15,-1.778 12.633,-1.6
3D body: height 5.9, standoff 3, extent 12.95,-1.778 13.433,-1.6
3D body: height 5.9, standoff 3, extent 13.75,-1.778 14.233,-1.6
3D body: height 5.9, standoff 3, extent 14.55,-1.778 15.033,-1.6
3D body: height 5.9, standoff 3, extent 15.35,-1.778 15.833,-1.6
3D body: height 5.9, standoff 3, extent 15.35,1.6 15.833,1.778
3D body: height 5.9, standoff 3, extent 14.55,1.6 15.033,1.778
3D body: height 5.9, standoff 3, extent 13.75,1.6 14.233,1.778
3D body: height 5.9, standoff 3, extent 12.95,1.6 13.433,1.778
3D body: height 5.9, standoff 3, extent 12.15,1.6 12.633,1.778
3D body: height 5.9, standoff 3, extent 11.35,1.6 11.833,1.778
3D body: height 5.9, standoff 3, extent 10.55,1.6 11.033,1.778
3D body: height 5.9, standoff 3, extent 9.75,1.6 10.233,1.778
3D body: height 5.9, standoff 3, extent 8.95,1.6 9.433,1.778
3D body: height 5.9, standoff 3, extent 8.15,1.6 8.633,1.778
3D body: height 5.9, standoff 3, extent 7.35,1.6 7.833,1.778
3D body: height 5.9, standoff 3, extent 6.55,1.6 7.033,1.778
3D body: height 5.9, standoff 3, extent 5.75,1.6 6.233,1.778
3D body: height 5.9, standoff 3, extent 4.95,1.6 5.433,1.778
3D body: height 5.9, standoff 3, extent 4.15,1.6 4.633,1.778
3D body: height 5.9, standoff 3, extent 3.35,1.6 3.833,1.778
3D body: height 5.9, standoff 3, extent 2.55,1.6 3.033,1.778
3D body: height 5.9, standoff 3, extent 1.75,1.6 2.233,1.778
3D body: height 5.9, standoff 3, extent 0.95,1.6 1.433,1.778
3D body: height 5.9, standoff 3, extent 0.15,1.6 0.633,1.778
3D body: height 5.9, standoff 3, extent -0.65,1.6 -0.167,1.778
3D body: height 5.9, standoff 3, extent -1.45,1.6 -0.967,1.778
3D body: height 5.9, standoff 3, extent -2.25,1.6 -1.767,1.778
3D body: height 5.9, standoff 3, extent -3.05,1.6 -2.567,1.778
3D body: height 5.9, standoff 3, extent -3.85,1.6 -3.367,1.778
3D body: height 5.9, standoff 3, extent -4.65,1.6 -4.167,1.778
3D body: height 5.9, standoff 3, extent -5.45,1.6 -4.967,1.778
3D body: height 5.9, standoff 3, extent -6.25,1.6 -5.767,1.778
3D body: height 5.9, standoff 3, extent -7.05,1.6 -6.567,1.778
3D body: height 5.9, standoff 3, extent -7.85,1.6 -7.367,1.778
3D body: height 5.9, standoff 3, extent -8.65,1.6 -8.167,1.778
3D body: height 5.9, standoff 3, extent -9.45,1.6 -8.967,1.778
3D body: height 5.9, standoff 3, extent -10.25,1.6 -9.767,1.778
3D body: height 5.9, standoff 3, extent -11.05,1.6 -10.567,1.778
3D body: height 5.9, standoff 3, extent -11.85,1.6 -11.367,1.778
3D body: height 5.9, standoff 3, extent -12.65,1.6 -12.167,1.778
3D body: height 5.9, standoff 3, extent -13.45,1.6 -12.967,1.778
3D body: height 5.9, standoff 3, extent -14.25,1.6 -13.767,1.778
3D body: height 5.9, standoff 3, extent -15.05,1.6 -14.567,1.778
3D body: height 3, standoff 0, extent -19.9,-2.15 19.9,2.15
3D body: height 0, standoff -0.8, extent 17.788,-1.567 19.012,-0.343
3D body: height 6, standoff 3, extent -17.35,-2.15 0,2.15
3D body: height 6, standoff 3, extent 0,-2.15 17.35,2.15
3D body: height 5.9, standoff 3, extent -15.85,1.6 -15.367,1.778
3D body: height 0, standoff -0.8, extent -18.907,-1.457 -17.897,-0.447

## CN80R0.8PCBFX6VM [mm] "0.8mm Pitch Stacking Height 6mm Receptacle-Stacking Connector male"
height 6
pads (82):
  rect 0.5x3.35 smd: 1(15.6,-2.425) 2(15.6,2.425) 3(14.8,-2.425) 4(14.8,2.425) 5(14,-2.425) 6(14,2.425) 7(13.2,-2.425) 8(13.2,2.425) 9(12.4,-2.425) 10(12.4,2.425) 11(11.6,-2.425) 12(11.6,2.425) 13(10.8,-2.425) 14(10.8,2.425) 15(10,-2.425) 16(10,2.425) 17(9.2,-2.425) 18(9.2,2.425) 19(8.4,-2.425) 20(8.4,2.425) 21(7.6,-2.425) 22(7.6,2.425) 23(6.8,-2.425) 24(6.8,2.425) 25(6,-2.425) 26(6,2.425) 27(5.2,-2.425) 28(5.2,2.425) 29(4.4,-2.425) 30(4.4,2.425) 31(3.6,-2.425) 32(3.6,2.425) 33(2.8,-2.425) 34(2.8,2.425) 35(2,-2.425) 36(2,2.425) 37(1.2,-2.425) 38(1.2,2.425) 39(0.4,-2.425) 40(0.4,2.425) 41(-0.4,-2.425) 42(-0.4,2.425) 43(-1.2,-2.425) 44(-1.2,2.425) 45(-2,-2.425) 46(-2,2.425) 47(-2.8,-2.425) 48(-2.8,2.425) 49(-3.6,-2.425) 50(-3.6,2.425) 51(-4.4,-2.425) 52(-4.4,2.425) 53(-5.2,-2.425) 54(-5.2,2.425) 55(-6,-2.425) 56(-6,2.425) 57(-6.8,-2.425) 58(-6.8,2.425) 59(-7.6,-2.425) 60(-7.6,2.425) 61(-8.4,-2.425) 62(-8.4,2.425) 63(-9.2,-2.425) 64(-9.2,2.425) 65(-10,-2.425) 66(-10,2.425) 67(-10.8,-2.425) 68(-10.8,2.425) 69(-11.6,-2.425) 70(-11.6,2.425) 71(-12.4,-2.425) 72(-12.4,2.425) 73(-13.2,-2.425) 74(-13.2,2.425) 75(-14,-2.425) 76(-14,2.425) 77(-14.8,-2.425) 78(-14.8,2.425) 79(-15.6,-2.425) 80(-15.6,2.425)
  round 0 hole 1.3 unplated: MH1(17.6,-1.45)
  round 0 hole 1 unplated: MH2(-17.6,-1.45)
Top Overlay:
  circle w0.178: c16.436,-3.429 r0.074
Mechanical 13:
  circle w0.381: c16.385,-2.159 r0.125
  lines w0.102: -17.35,-2.85 -17.35,-0.635 -17.35,0.127 -18.593,0.127 -18.593,1.753 -17.348,1.753 -17.348,2.85 ; 17.348,2.85 17.348,1.753 18.593,1.753 18.593,0.127 17.35,0.127 17.35,-0.635 17.35,-2.85 ; -16.256,-1.27 16.256,-1.27 16.256,1.27 -16.256,1.27 -16.256,-1.27
  lines w0.127: -19.9,-2.85 -19.9,2.85 19.898,2.85 19.898,-1.311 18.359,-2.85 -19.9,-2.85
Mechanical 15:
  lines w0.102: -0.5,0 0.5,0 ; 0,-0.5 0,0.5 ; -20.574,-4.064 -20.574,4.064 -20.066,4.064 20.32,4.064 20.32,-4.064 -20.574,-4.064
3D body: height 6, standoff 3, extent -15.85,-1.473 -15.367,-1.27
3D body: height 6, standoff 3, extent -15.05,-1.473 -14.567,-1.27
3D body: height 6, standoff 3, extent -14.25,-1.473 -13.767,-1.27
3D body: height 6, standoff 3, extent -13.45,-1.473 -12.967,-1.27
3D body: height 6, standoff 3, extent -12.65,-1.473 -12.167,-1.27
3D body: height 6, standoff 3, extent -11.85,-1.473 -11.367,-1.27
3D body: height 6, standoff 3, extent -11.05,-1.473 -10.567,-1.27
3D body: height 6, standoff 3, extent -10.25,-1.473 -9.767,-1.27
3D body: height 6, standoff 3, extent -9.45,-1.473 -8.967,-1.27
3D body: height 6, standoff 3, extent -8.65,-1.473 -8.167,-1.27
3D body: height 6, standoff 3, extent -7.85,-1.473 -7.367,-1.27
3D body: height 6, standoff 3, extent -7.05,-1.473 -6.567,-1.27
3D body: height 6, standoff 3, extent -6.25,-1.473 -5.767,-1.27
3D body: height 6, standoff 3, extent -5.45,-1.473 -4.967,-1.27
3D body: height 6, standoff 3, extent -4.65,-1.473 -4.167,-1.27
3D body: height 6, standoff 3, extent -3.85,-1.473 -3.367,-1.27
3D body: height 6, standoff 3, extent -3.05,-1.473 -2.567,-1.27
3D body: height 6, standoff 3, extent -2.25,-1.473 -1.767,-1.27
3D body: height 6, standoff 3, extent -1.45,-1.473 -0.967,-1.27
3D body: height 6, standoff 3, extent -0.65,-1.473 -0.167,-1.27
3D body: height 6, standoff 3, extent 0.15,-1.473 0.633,-1.27
3D body: height 6, standoff 3, extent 0.95,-1.473 1.433,-1.27
3D body: height 6, standoff 3, extent 1.75,-1.473 2.233,-1.27
3D body: height 6, standoff 3, extent 2.55,-1.473 3.033,-1.27
3D body: height 6, standoff 3, extent 3.35,-1.473 3.833,-1.27
3D body: height 6, standoff 3, extent 4.15,-1.473 4.633,-1.27
3D body: height 6, standoff 3, extent 4.95,-1.473 5.433,-1.27
3D body: height 6, standoff 3, extent 5.75,-1.473 6.233,-1.27
3D body: height 6, standoff 3, extent 6.55,-1.473 7.033,-1.27
3D body: height 6, standoff 3, extent 7.35,-1.473 7.833,-1.27
3D body: height 6, standoff 3, extent 8.15,-1.473 8.633,-1.27
3D body: height 6, standoff 3, extent 8.95,-1.473 9.433,-1.27
3D body: height 6, standoff 3, extent 9.75,-1.473 10.233,-1.27
3D body: height 6, standoff 3, extent 10.55,-1.473 11.033,-1.27
3D body: height 6, standoff 3, extent 11.35,-1.473 11.833,-1.27
3D body: height 6, standoff 3, extent 12.15,-1.473 12.633,-1.27
3D body: height 6, standoff 3, extent 12.95,-1.473 13.433,-1.27
3D body: height 6, standoff 3, extent 13.75,-1.473 14.233,-1.27
3D body: height 6, standoff 3, extent 14.55,-1.473 15.033,-1.27
3D body: height 6, standoff 3, extent 15.35,-1.473 15.833,-1.27
3D body: height 6, standoff 3, extent 15.35,1.27 15.833,1.473
3D body: height 6, standoff 3, extent 14.55,1.27 15.033,1.473
3D body: height 6, standoff 3, extent 13.75,1.27 14.233,1.473
3D body: height 6, standoff 3, extent 12.95,1.27 13.433,1.473
3D body: height 6, standoff 3, extent 12.15,1.27 12.633,1.473
3D body: height 6, standoff 3, extent 11.35,1.27 11.833,1.473
3D body: height 6, standoff 3, extent 10.55,1.27 11.033,1.473
3D body: height 6, standoff 3, extent 9.75,1.27 10.233,1.473
3D body: height 6, standoff 3, extent 8.95,1.27 9.433,1.473
3D body: height 6, standoff 3, extent 8.15,1.27 8.633,1.473
3D body: height 6, standoff 3, extent 7.35,1.27 7.833,1.473
3D body: height 6, standoff 3, extent 6.55,1.27 7.033,1.473
3D body: height 6, standoff 3, extent 5.75,1.27 6.233,1.473
3D body: height 6, standoff 3, extent 4.95,1.27 5.433,1.473
3D body: height 6, standoff 3, extent 4.15,1.27 4.633,1.473
3D body: height 6, standoff 3, extent 3.35,1.27 3.833,1.473
3D body: height 6, standoff 3, extent 2.55,1.27 3.033,1.473
3D body: height 6, standoff 3, extent 1.75,1.27 2.233,1.473
3D body: height 6, standoff 3, extent 0.95,1.27 1.433,1.473
3D body: height 6, standoff 3, extent 0.15,1.27 0.633,1.473
3D body: height 6, standoff 3, extent -0.65,1.27 -0.167,1.473
3D body: height 6, standoff 3, extent -1.45,1.27 -0.967,1.473
3D body: height 6, standoff 3, extent -2.25,1.27 -1.767,1.473
3D body: height 6, standoff 3, extent -3.05,1.27 -2.567,1.473
3D body: height 6, standoff 3, extent -3.85,1.27 -3.367,1.473
3D body: height 6, standoff 3, extent -4.65,1.27 -4.167,1.473
3D body: height 6, standoff 3, extent -5.45,1.27 -4.967,1.473
3D body: height 6, standoff 3, extent -6.25,1.27 -5.767,1.473
3D body: height 6, standoff 3, extent -7.05,1.27 -6.567,1.473
3D body: height 6, standoff 3, extent -7.85,1.27 -7.367,1.473
3D body: height 6, standoff 3, extent -8.65,1.27 -8.167,1.473
3D body: height 6, standoff 3, extent -9.45,1.27 -8.967,1.473
3D body: height 6, standoff 3, extent -10.25,1.27 -9.767,1.473
3D body: height 6, standoff 3, extent -11.05,1.27 -10.567,1.473
3D body: height 6, standoff 3, extent -11.85,1.27 -11.367,1.473
3D body: height 6, standoff 3, extent -12.65,1.27 -12.167,1.473
3D body: height 6, standoff 3, extent -13.45,1.27 -12.967,1.473
3D body: height 6, standoff 3, extent -14.25,1.27 -13.767,1.473
3D body: height 6, standoff 3, extent -15.05,1.27 -14.567,1.473
3D body: height 6, standoff 3, extent -15.85,1.27 -15.367,1.473
3D body: height 6, standoff 3, extent -16.256,-1.27 16.256,1.27
3D body: height 0, standoff -0.8, extent 17,-2.063 18.223,-0.839
3D body: height 3, standoff 0, extent -19.9,-2.85 19.9,2.85
3D body: height 6, standoff 3, extent 0,-2.85 19.9,2.85
3D body: height 6, standoff 0, extent -19.9,-2.85 0,2.85
3D body: height 0, standoff -0.8, extent -18.104,-1.943 -17.094,-0.933

## CN43650-0225 [mm] "CN 2 pin Male vertical SMD R3.0"
height 9.4
pads (4):
  rect 1.3x2.6 smd: 1(1.5,3.4) 2(-1.5,3.4)
  rect 3.5x1.7 smd: MP1(-5.35,0) MP2(5.35,0)
Mechanical 13:
  lines w0.1: -4.8,-1.25 -3.3,-1.25 ; -4.8,1.5 -3.3,1.5 ; -3.3,-2.2 -3.3,2.2 ; -1.35,2.2 -1.35,3.7 1.35,3.7 1.35,2.2 ; -0.35,-2.2 -0.35,-2.425 0.35,-2.425 0.35,-2.2 ; 3.3,-2.2 3.3,2.2 ; 3.3,-1.25 4.8,-1.25 ; 3.3,1.5 4.8,1.5 ; -4.8,-2.2 4.8,-2.2 4.8,2.2 -4.8,2.2 -4.8,-2.2 ; -2.85,-1.35 -2.85,1.35 -0.15,1.35 -0.15,-1.35 -2.85,-1.35 ; 0.15,-0.55 0.15,1.35 2.85,1.35 2.85,-1.35 0.95,-1.35 0.15,-0.55
3D body: height 9.93, standoff -0.32, extent -6.825,-2.435 6.825,4.035